# Altium footprint library mylib.PcbLib: 82 footprints (part 6 of 6)
Each footprint in its own frame and in the unit in brackets; x right, y up, seen from the top. Pads: shape width x height; smd on the part's side, far side on the other; paste and mask are expansions set on the pad; w line width, h text height; cw(c..) or ccw(c..) is an arc to the next point about the centre after c.
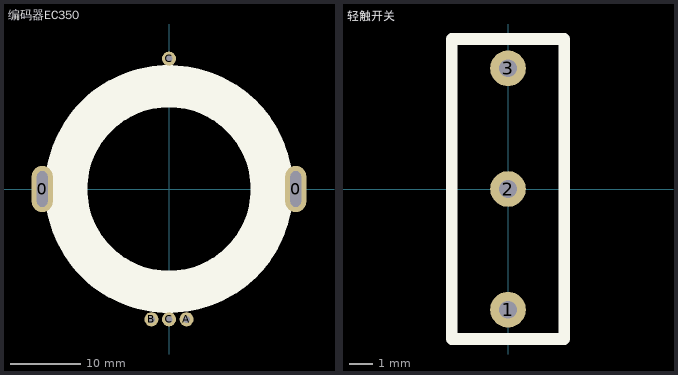
[diagram p5: the footprints below, top view; thin cyan lines are the x and y axes]

## 编码器EC350 [mm]
pads (6):
  oval 3x6.6 hole 1.5 slot 5.1 at 90 deg: 0(-18,0) 0(18,0)
  round 2 hole 1: A(2.5,-18.5) B(-2.5,-18.5) C(0,-18.5) C(0,18.5)
Top Overlay:
  circle w0.2: c0,0 r17.5
  circle w0.2: c0,0 r11.7
  circle w5.8: c0,0 r14.6
Keep-Out Layer:
  board cut-out: 0,13.85 -0.084,13.85 -0.248,13.883 -0.403,13.947 -0.542,14.04 -0.66,14.158 -0.753,14.297 -0.817,14.452 -0.85,14.616 -0.85,14.7 -0.85,14.784 -0.817,14.948 -0.753,15.103 -0.66,15.242 -0.542,15.36 -0.403,15.453 -0.248,15.517 -0.084,15.55 0,15.55 0.084,15.55 0.248,15.517 0.403,15.453 0.542,15.36 0.66,15.242 0.753,15.103 0.817,14.948 0.85,14.784 0.85,14.7 0.85,14.616 0.817,14.452 0.753,14.297 0.66,14.158 0.542,14.04 0.403,13.947 0.248,13.883 0.084,13.85
  board cut-out: -0.85,-14.7 -0.85,-14.784 -0.817,-14.948 -0.753,-15.103 -0.66,-15.242 -0.542,-15.36 -0.403,-15.453 -0.248,-15.517 -0.084,-15.55 0,-15.55 0.084,-15.55 0.248,-15.517 0.403,-15.453 0.542,-15.36 0.66,-15.242 0.753,-15.103 0.817,-14.948 0.85,-14.784 0.85,-14.7 0.85,-14.616 0.817,-14.452 0.753,-14.297 0.66,-14.158 0.542,-14.04 0.403,-13.947 0.248,-13.883 0.084,-13.85 0,-13.85 -0.084,-13.85 -0.248,-13.883 -0.403,-13.947 -0.542,-14.04 -0.66,-14.158 -0.753,-14.297 -0.817,-14.452 -0.85,-14.616
Mechanical 1:
  circle w0.2: c0,14.7 r0.85
  circle w0.2: c0,-14.7 r0.85

## 轻触开关 [mil] "S"
pads (3):
  round 60 hole 30: 1(0,-202.76) 2(0,0) 3(0,202.76)
Top Overlay:
  lines w20: -94.49,-251.97 94.49,-251.97 ; -94.49,-249.49 -94.49,251.97 94.49,251.97 94.49,-250
3D body: height 10, standoff 0, extent 0,0 0,0
3D body: height 228.35, standoff 0, extent -95,-255 95,250